# Altium footprint library PCB贴片元件封装库.pcblib: 366 footprints (part 11 of 23)
Each footprint in its own frame and in the unit in brackets; x right, y up, seen from the top. Pads: shape width x height; smd on the part's side, far side on the other; paste and mask are expansions set on the pad; w line width, h text height; cw(c..) or ccw(c..) is an arc to the next point about the centre after c.
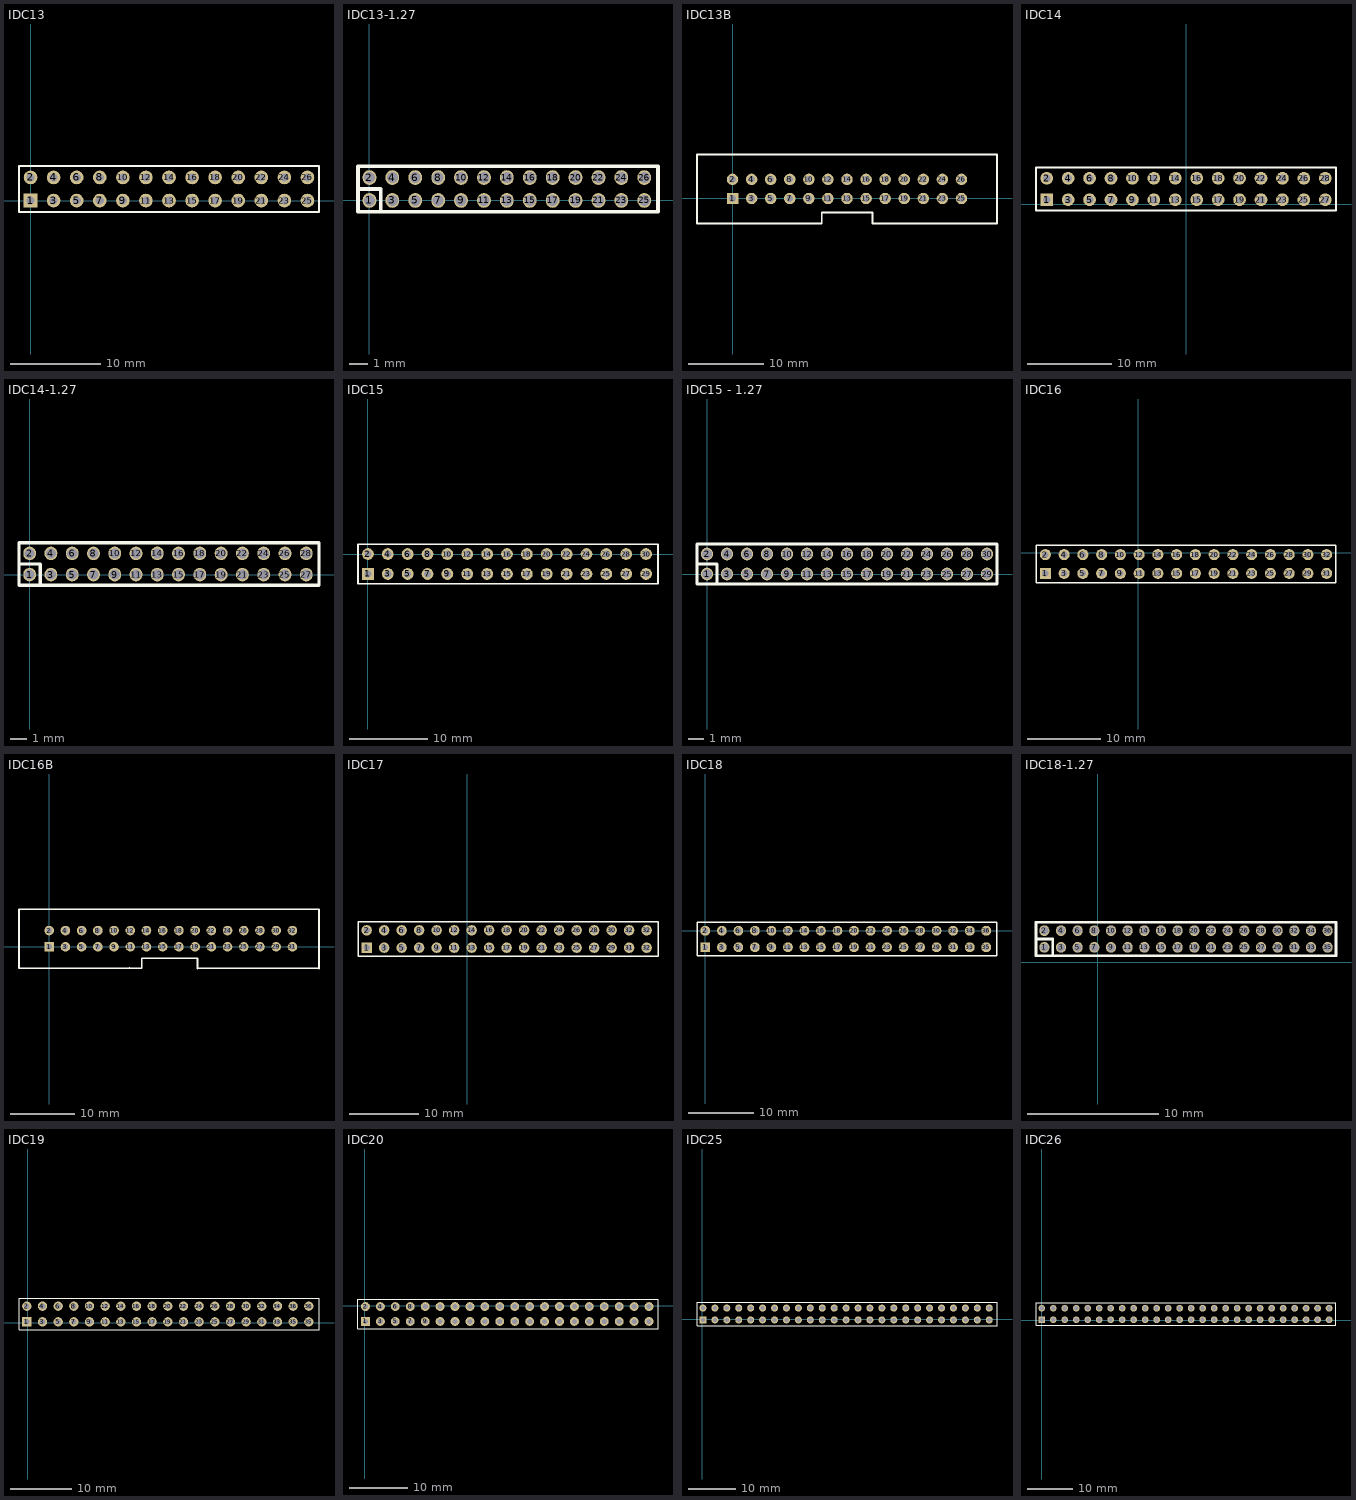
[diagram p10: the footprints below, top view; thin cyan lines are the x and y axes]

## IDC13 [mm]
pads (26):
  rect 1.5x1.5 hole 0.9: 1(0,0)
  round 1.5 hole 0.9: 2(0,2.54) 3(2.54,0) 4(2.54,2.54) 5(5.08,0) 6(5.08,2.54) 7(7.62,0) 8(7.62,2.54) 9(10.16,0) 10(10.16,2.54) 11(12.7,0) 12(12.7,2.54) 13(15.24,0) 14(15.24,2.54) 15(17.78,0) 16(17.78,2.54) 17(20.32,0) 18(20.32,2.54) 19(22.86,0) 20(22.86,2.54) 21(25.4,0) 22(25.4,2.54) 23(27.94,0) 24(27.94,2.54) 25(30.48,0) 26(30.48,2.54)
TopOverlay:
  lines w0.2: -1.27,-1.27 31.75,-1.27 31.75,3.81 -1.27,3.81 -1.27,-1.27

## IDC13-1.27 [mil]
pads (26):
  oval 30x32 hole 24: 1(0,0) 2(0,50) 3(50,0) 4(50,50) 5(100,0) 6(100,50) 7(150,0) 8(150,50) 9(200,0) 10(200,50) 11(250,0) 12(250,50) 13(300,0) 14(300,50) 15(350,0) 16(350,50) 17(400,0) 18(400,50) 19(450,0) 20(450,50) 21(500,0) 22(500,50) 23(550,0) 24(550,50) 25(600,0) 26(600,50)
TopOverlay:
  lines w8: -25,25 25,25 25,-25 ; -25,-25 630,-25 630,75 -25,75 -25,-25

## IDC13B [mil]
pads (26):
  rect 60x60 hole 35: 1(0,0)
  round 60 hole 35: 2(0,100) 3(100,0) 4(100,100) 5(200,0) 6(200,100) 7(300,0) 8(300,100) 9(400,0) 10(400,100) 11(500,0) 12(500,100) 13(600,0) 14(600,100) 15(700,0) 16(700,100) 17(800,0) 18(800,100) 19(900,0) 20(900,100) 21(1000,0) 22(1000,100) 23(1100,0) 24(1100,100) 25(1200,0) 26(1200,100)
TopOverlay:
  lines w10: 183,-131.58 467.63,-131.58 467.63,-73.2 733.05,-73.2 733.05,-128.41 ; 324.91,-131.58 -186.22,-131.58 -186.22,231.02 ; 733.58,-131 1386.22,-131 1386.2,231.02 ; 1072.05,231.02 -186.22,231.02 ; -186.22,231.02 1386.2,231.02 ; 1386.2,231.02 1386.22,231

## IDC14 [mm]
pads (28):
  rect 1.5x1.5 hole 0.9: 1(-16.51,0.508)
  round 1.5 hole 0.9: 2(-16.51,3.048) 3(-13.97,0.508) 4(-13.97,3.048) 5(-11.43,0.508) 6(-11.43,3.048) 7(-8.89,0.508) 8(-8.89,3.048) 9(-6.35,0.508) 10(-6.35,3.048) 11(-3.81,0.508) 12(-3.81,3.048) 13(-1.27,0.508) 14(-1.27,3.048) 15(1.27,0.508) 16(1.27,3.048) 17(3.81,0.508) 18(3.81,3.048) 19(6.35,0.508) 20(6.35,3.048) 21(8.89,0.508) 22(8.89,3.048) 23(11.43,0.508) 24(11.43,3.048) 25(13.97,0.508) 26(13.97,3.048) 27(16.51,0.508) 28(16.51,3.048)
TopOverlay:
  lines w0.2: -17.78,-0.762 -17.78,4.318 17.78,4.318 17.78,-0.762 -17.78,-0.762

## IDC14-1.27 [mil]
pads (28):
  oval 30x32 hole 24: 1(0,0) 2(0,50) 3(50,0) 4(50,50) 5(100,0) 6(100,50) 7(150,0) 8(150,50) 9(200,0) 10(200,50) 11(250,0) 12(250,50) 13(300,0) 14(300,50) 15(350,0) 16(350,50) 17(400,0) 18(400,50) 19(450,0) 20(450,50) 21(500,0) 22(500,50) 23(550,0) 24(550,50) 25(600,0) 26(600,50) 27(650,0) 28(650,50)
TopOverlay:
  lines w8: -25,25 25,25 25,-25 ; -25,-25 -25,75 680,75 680,-25 -25,-25

## IDC15 [mm]
pads (30):
  rect 1.5x1.5 hole 0.9: 1(0,-2.54)
  round 1.5 hole 0.9: 2(0,0) 3(2.54,-2.54) 4(2.54,0) 5(5.08,-2.54) 6(5.08,0) 7(7.62,-2.54) 8(7.62,0) 9(10.16,-2.54) 10(10.16,0) 11(12.7,-2.54) 12(12.7,0) 13(15.24,-2.54) 14(15.24,0) 15(17.78,-2.54) 16(17.78,0) 17(20.32,-2.54) 18(20.32,0) 19(22.86,-2.54) 20(22.86,0) 21(25.4,-2.54) 22(25.4,0) 23(27.94,-2.54) 24(27.94,0) 25(30.48,-2.54) 26(30.48,0) 27(33.02,-2.54) 28(33.02,0) 29(35.56,-2.54) 30(35.56,0)
TopOverlay:
  lines w0.2: -1.27,-3.81 -1.27,1.27 37.084,1.27 37.084,-3.81 -1.27,-3.81

## IDC15 - 1.27 [mil]
pads (30):
  oval 30x32 hole 24: 1(0,0) 2(0,50) 3(50,0) 4(50,50) 5(100,0) 6(100,50) 7(150,0) 8(150,50) 9(200,0) 10(200,50) 11(250,0) 12(250,50) 13(300,0) 14(300,50) 15(350,0) 16(350,50) 17(400,0) 18(400,50) 19(450,0) 20(450,50) 21(500,0) 22(500,50) 23(550,0) 24(550,50) 25(600,0) 26(600,50) 27(650,0) 28(650,50) 29(700,0) 30(700,50)
TopOverlay:
  lines w8: -25,25 25,25 25,-25 ; -25,-25 -25,75 725,75 725,-25 -25,-25

## IDC16 [mm]
pads (32):
  rect 1.5x1.5 hole 0.9: 1(-12.573,-2.794)
  round 1.5 hole 0.9: 2(-12.573,-0.254) 3(-10.033,-2.794) 4(-10.033,-0.254) 5(-7.493,-2.794) 6(-7.493,-0.254) 7(-4.953,-2.794) 8(-4.953,-0.254) 9(-2.413,-2.794) 10(-2.413,-0.254) 11(0.127,-2.794) 12(0.127,-0.254) 13(2.667,-2.794) 14(2.667,-0.254) 15(5.207,-2.794) 16(5.207,-0.254) 17(7.747,-2.794) 18(7.747,-0.254) 19(10.287,-2.794) 20(10.287,-0.254) 21(12.827,-2.794) 22(12.827,-0.254) 23(15.367,-2.794) 24(15.367,-0.254) 25(17.907,-2.794) 26(17.907,-0.254) 27(20.447,-2.794) 28(20.447,-0.254) 29(22.987,-2.794) 30(22.987,-0.254) 31(25.527,-2.794) 32(25.527,-0.254)
TopOverlay:
  lines w0.2: -13.843,-4.064 26.797,-4.064 26.797,1.016 -13.843,1.016 -13.843,-4.064

## IDC16B [mil]
pads (32):
  rect 59x59 hole 35: 1(0,0)
  round 59 hole 35: 2(0,100) 3(100,0) 4(100,100) 5(200,0) 6(200,100) 7(300,0) 8(300,100) 10(400,100) 11(500,0) 12(500,100) 13(600,0) 14(600,100) 15(700,0) 16(700,100) 17(800,0) 18(800,100) 19(900,0) 20(900,100) 21(1000,0) 22(1000,100) 23(1100,0) 24(1100,100) 25(1200,0) 26(1200,100) 27(1300,0) 28(1300,100) 29(1400,0) 30(1400,100) 31(1500,0) 32(1500,100)
  round 59 hole 25: 9(400,0)
TopOverlay:
  lines w10: 495,-130 493.42,-131.58 ; 913,-70 615,-70 570,-70 570,-130 568.42,-131.58 493.42,-131.58 ; 915,-135 915,-72 ; 917,-133 935,-133 1562,-133 1663,-133 1663.98,-133.98 1663.98,231.02 1555,231.02 ; 1562,231.02 -186.22,231.02 -186.22,-131.58 324.91,-131.58 486.58,-131.58 493.42,-131.58

## IDC17 [mm]
pads (34):
  rect 1.5x1.5 hole 0.9: 1(-14.605,-69.85)
  round 1.5 hole 0.9: 2(-14.605,-67.31) 3(-12.065,-69.85) 4(-12.065,-67.31) 5(-9.525,-69.85) 6(-9.525,-67.31) 7(-6.985,-69.85) 8(-6.985,-67.31) 9(-4.445,-69.85) 10(-4.445,-67.31) 11(-1.905,-69.85) 12(-1.905,-67.31) 13(0.635,-69.85) 14(0.635,-67.31) 15(3.175,-69.85) 16(3.175,-67.31) 17(5.715,-69.85) 18(5.715,-67.31) 19(8.255,-69.85) 20(8.255,-67.31) 21(10.795,-69.85) 22(10.795,-67.31) 23(13.335,-69.85) 24(13.335,-67.31) 25(15.875,-69.85) 26(15.875,-67.31) 27(18.415,-69.85) 28(18.415,-67.31) 29(20.955,-69.85) 30(20.955,-67.31) 31(23.495,-69.85) 32(23.495,-67.31) 32(26.035,-69.85) 32(26.035,-67.31)
TopOverlay:
  lines w0.2: -15.875,-71.12 27.686,-71.12 27.686,-66.04 -15.875,-66.04 -15.875,-71.12

## IDC18 [mm]
pads (36):
  rect 1.5x1.5 hole 0.9: 1(0,-2.54)
  round 1.5 hole 0.9: 2(0,0) 3(2.54,-2.54) 4(2.54,0) 5(5.08,-2.54) 6(5.08,0) 7(7.62,-2.54) 8(7.62,0) 9(10.16,-2.54) 10(10.16,0) 11(12.7,-2.54) 12(12.7,0) 13(15.24,-2.54) 14(15.24,0) 15(17.78,-2.54) 16(17.78,0) 17(20.32,-2.54) 18(20.32,0) 19(22.86,-2.54) 20(22.86,0) 21(25.4,-2.54) 22(25.4,0) 23(27.94,-2.54) 24(27.94,0) 25(30.48,-2.54) 26(30.48,0) 27(33.02,-2.54) 28(33.02,0) 29(35.56,-2.54) 30(35.56,0) 31(38.1,-2.54) 32(38.1,0) 33(40.64,-2.54) 34(40.64,0) 35(43.18,-2.54) 36(43.18,0)
TopOverlay:
  lines w0.2: -1.27,-3.81 44.831,-3.81 44.831,1.27 -1.27,1.27 -1.27,-3.81

## IDC18-1.27 [mil]
pads (36):
  oval 30x32 hole 24: 1(-160,45) 2(-160,95) 3(-110,45) 4(-110,95) 5(-60,45) 6(-60,95) 7(-10,45) 8(-10,95) 9(40,45) 10(40,95) 11(90,45) 12(90,95) 13(140,45) 14(140,95) 15(190,45) 16(190,95) 17(240,45) 18(240,95) 19(290,45) 20(290,95) 21(340,45) 22(340,95) 23(390,45) 24(390,95) 25(440,45) 26(440,95) 27(490,45) 28(490,95) 29(540,45) 30(540,95) 31(590,45) 32(590,95) 33(640,45) 34(640,95) 35(690,45) 36(690,95)
TopOverlay:
  lines w8: -185,70 -135,70 -135,20 ; -185,20 715,20 715,120 -185,120 -185,20

## IDC19 [mm]
pads (38):
  rect 1.5x1.5 hole 0.9: 1(-0.127,0.127)
  round 1.5 hole 0.9: 2(-0.127,2.667) 3(2.413,0.127) 4(2.413,2.667) 5(4.953,0.127) 6(4.953,2.667) 7(7.493,0.127) 8(7.493,2.667) 9(10.033,0.127) 10(10.033,2.667) 11(12.573,0.127) 12(12.573,2.667) 13(15.113,0.127) 14(15.113,2.667) 15(17.653,0.127) 16(17.653,2.667) 17(20.193,0.127) 18(20.193,2.667) 19(22.733,0.127) 20(22.733,2.667) 21(25.273,0.127) 22(25.273,2.667) 23(27.813,0.127) 24(27.813,2.667) 25(30.353,0.127) 26(30.353,2.667) 27(32.893,0.127) 28(32.893,2.667) 29(35.433,0.127) 30(35.433,2.667) 31(37.973,0.127) 32(37.973,2.667) 33(40.513,0.127) 34(40.513,2.667) 35(43.053,0.127) 35(45.593,0.127) 36(43.053,2.667) 36(45.593,2.667)
TopOverlay:
  lines w0.2: -1.397,-1.143 47.244,-1.143 47.244,3.937 -1.397,3.937 -1.397,-1.143

## IDC20 [mm]
pads (40):
  rect 1.5x1.5 hole 0.9: 1(0.127,-2.667)
  round 1.5 hole 0.9: 2(0.127,-0.127) 3(2.667,-2.667) 4(2.667,-0.127) 5(5.207,-2.667) 6(5.207,-0.127) 7(7.747,-2.667) 8(7.747,-0.127) 9(10.287,-2.667) 10(10.287,-0.127) 11(12.827,-2.667) 12(12.827,-0.127) 13(15.367,-2.667) 14(15.367,-0.127) 15(17.907,-2.667) 16(17.907,-0.127) 17(20.447,-2.667) 18(20.447,-0.127) 19(22.987,-2.667) 20(22.987,-0.127) 21(25.527,-2.667) 22(25.527,-0.127) 23(28.067,-2.667) 24(28.067,-0.127) 25(30.607,-2.667) 26(30.607,-0.127) 27(33.147,-2.667) 28(33.147,-0.127) 29(35.687,-2.667) 30(35.687,-0.127) 31(38.227,-2.667) 32(38.227,-0.127) 33(40.767,-2.667) 34(40.767,-0.127) 35(43.307,-2.667) 36(43.307,-0.127) 37(45.847,-2.667) 38(45.847,-0.127) 39(48.387,-2.667) 40(48.387,-0.127)
TopOverlay:
  lines w0.2: -1.143,-3.937 49.911,-3.937 49.911,1.143 -1.143,1.143 -1.143,-3.937

## IDC25 [mm]
pads (50):
  rect 1.5x1.5 hole 0.9: 1(0.127,-0.127)
  round 1.5 hole 0.9: 2(0.127,2.413) 3(2.667,-0.127) 4(2.667,2.413) 5(5.207,-0.127) 6(5.207,2.413) 7(7.747,-0.127) 8(7.747,2.413) 9(10.287,-0.127) 10(10.287,2.413) 11(12.827,-0.127) 12(12.827,2.413) 13(15.367,-0.127) 14(15.367,2.413) 15(17.907,-0.127) 16(17.907,2.413) 17(20.447,-0.127) 18(20.447,2.413) 19(22.987,-0.127) 20(22.987,2.413) 21(25.527,-0.127) 22(25.527,2.413) 23(28.067,-0.127) 24(28.067,2.413) 25(30.607,-0.127) 26(30.607,2.413) 27(33.147,-0.127) 28(33.147,2.413) 29(35.687,-0.127) 30(35.687,2.413) 31(38.227,-0.127) 32(38.227,2.413) 33(40.767,-0.127) 34(40.767,2.413) 35(43.307,-0.127) 36(43.307,2.413) 37(45.847,-0.127) 38(45.847,2.413) 39(48.387,-0.127) 40(48.387,2.413) 41(50.927,-0.127) 42(50.927,2.413) 43(53.467,-0.127) 44(53.467,2.413) 45(56.007,-0.127) 46(56.007,2.413) 47(58.547,-0.127) 48(58.547,2.413) 49(61.087,-0.127) 50(61.087,2.413)
TopOverlay:
  lines w0.2: -1.143,-1.397 -1.143,3.683 62.738,3.683 62.738,-1.397 -1.143,-1.397

## IDC26 [mm]
pads (52):
  rect 1.5x1.5 hole 0.9: 1(0,0.127)
  round 1.5 hole 0.9: 2(0,2.667) 3(2.54,0.127) 4(2.54,2.667) 5(5.08,0.127) 6(5.08,2.667) 7(7.62,0.127) 8(7.62,2.667) 9(10.16,0.127) 10(10.16,2.667) 11(12.7,0.127) 12(12.7,2.667) 13(15.24,0.127) 14(15.24,2.667) 15(17.78,0.127) 16(17.78,2.667) 17(20.32,0.127) 18(20.32,2.667) 19(22.86,0.127) 20(22.86,2.667) 21(25.4,0.127) 22(25.4,2.667) 23(27.94,0.127) 24(27.94,2.667) 25(30.48,0.127) 26(30.48,2.667) 27(33.02,0.127) 28(33.02,2.667) 29(35.56,0.127) 30(35.56,2.667) 31(38.1,0.127) 32(38.1,2.667) 33(40.64,0.127) 34(40.64,2.667) 35(43.18,0.127) 36(43.18,2.667) 37(45.72,0.127) 38(45.72,2.667) 39(48.26,0.127) 40(48.26,2.667) 41(50.8,0.127) 42(50.8,2.667) 43(53.34,0.127) 44(53.34,2.667) 45(55.88,0.127) 46(55.88,2.667) 47(58.42,0.127) 48(58.42,2.667) 49(60.96,0.127) 50(60.96,2.667) 51(63.5,0.127) 52(63.5,2.667)
TopOverlay:
  lines w0.2: -1.27,-1.143 -1.27,3.937 65.024,3.937 65.024,-1.143 -1.27,-1.143